# Altium footprint library Amirreza.PcbLib: 524 footprints (part 31 of 33)
Each footprint in its own frame and in the unit in brackets; x right, y up, seen from the top. Pads: shape width x height; smd on the part's side, far side on the other; paste and mask are expansions set on the pad; w line width, h text height; cw(c..) or ccw(c..) is an arc to the next point about the centre after c.
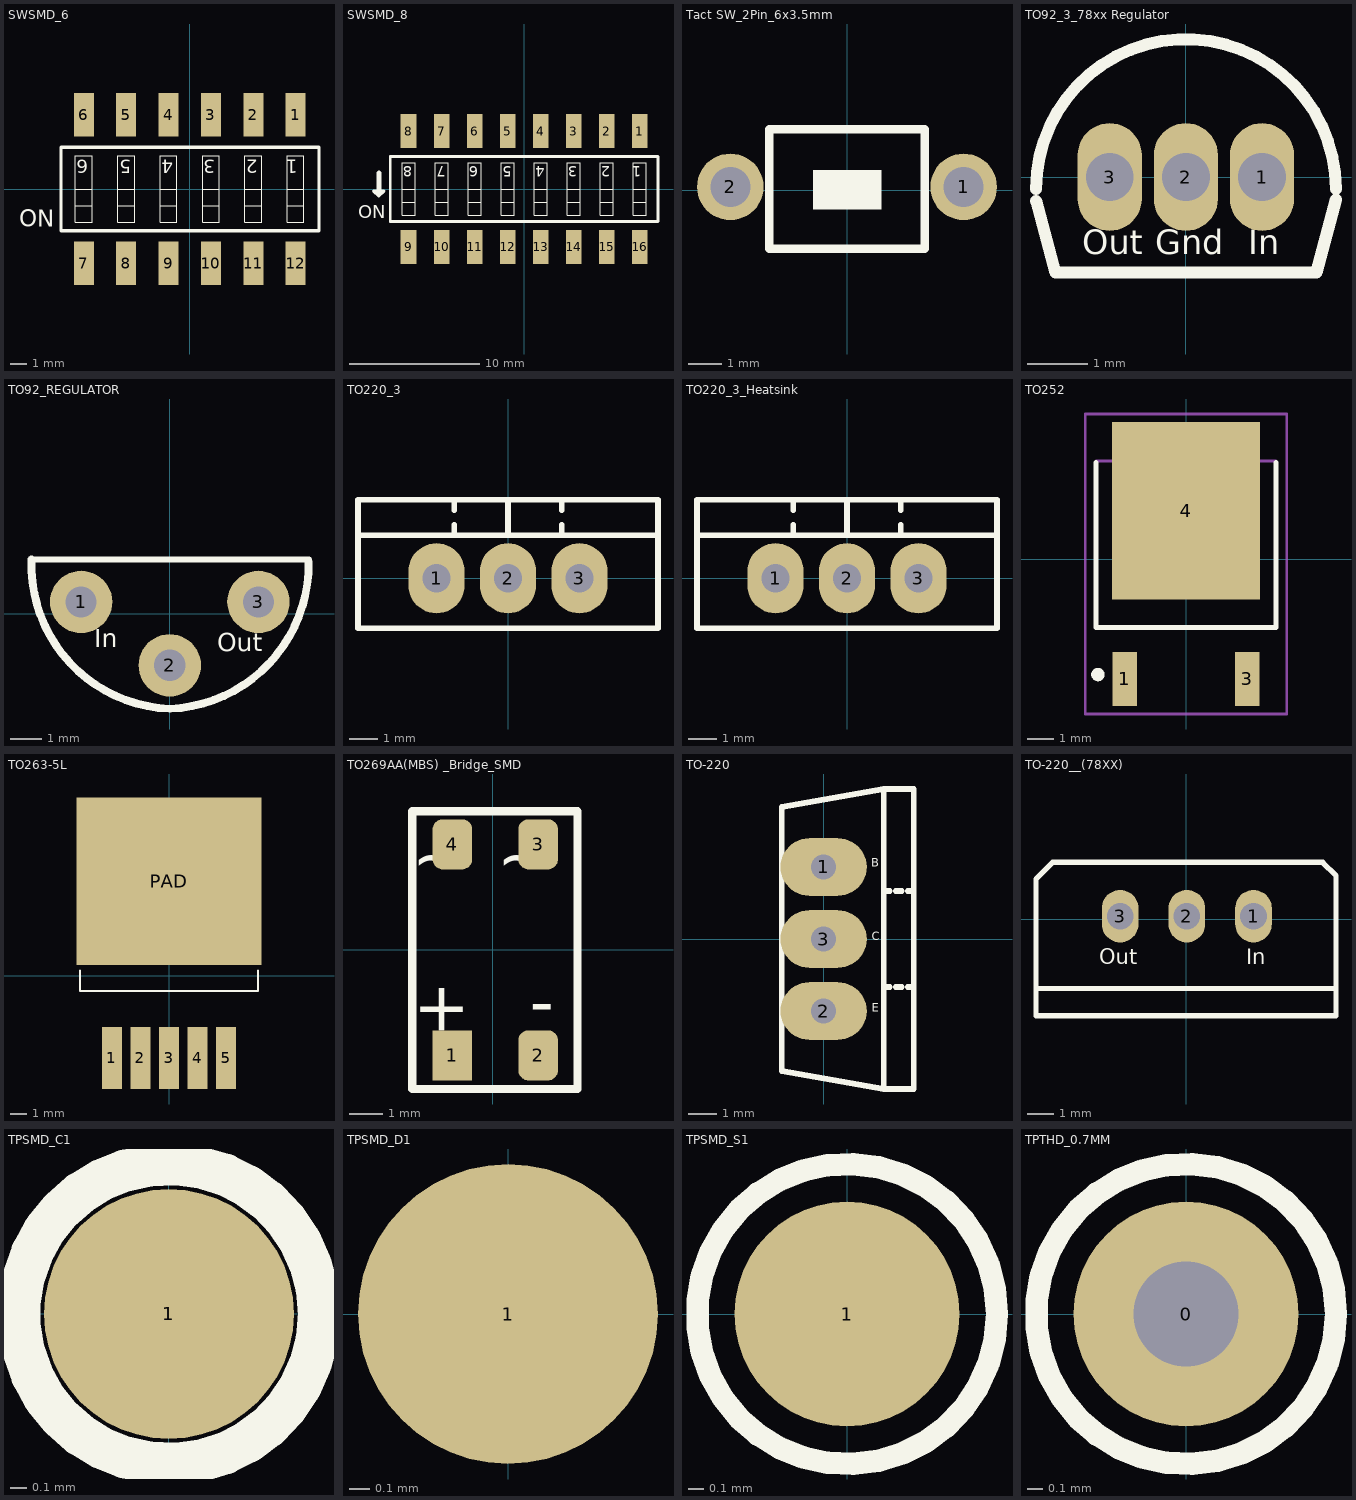
[diagram p30: the footprints below, top view; thin cyan lines are the x and y axes]

## SWSMD_6 [mm]
pads (12):
  rect 1.2x2.6 smd: 1(6.35,4.45) 2(3.81,4.45) 3(1.27,4.45) 4(-1.27,4.45) 5(-3.81,4.45) 6(-6.35,4.45) 7(-6.35,-4.45) 8(-3.81,-4.45) 9(-1.27,-4.45) 10(1.27,-4.45) 11(3.81,-4.45) 12(6.35,-4.45)
Top Overlay:
  lines w0.025: -6.85,-1 -5.85,-1 ; -6.85,0 -5.85,0 ; -4.31,-1 -3.31,-1 ; -4.31,0 -3.31,0 ; -1.77,-1 -0.77,-1 ; -1.77,0 -0.77,0 ; 0.77,-1 1.77,-1 ; 0.77,0 1.77,0 ; 3.31,-1 4.31,-1 ; 3.31,0 4.31,0 ; 5.85,-1 6.85,-1 ; 5.85,0 6.85,0 ; -6.85,-2 -6.85,2 -5.85,2 -5.85,-2 -6.85,-2 ; -4.31,-2 -4.31,2 -3.31,2 -3.31,-2 -4.31,-2 ; -1.77,-2 -1.77,2 -0.77,2 -0.77,-2 -1.77,-2 ; 0.77,-2 0.77,2 1.77,2 1.77,-2 0.77,-2 ; 3.31,-2 3.31,2 4.31,2 4.31,-2 3.31,-2 ; 5.85,-2 5.85,2 6.85,2 6.85,-2 5.85,-2
  lines w0.2: -7.722,-2.5 -7.722,2.5 7.75,2.5 7.75,-2.5 -7.722,-2.5
  text "ON" at -10.236,-2.256 h1
  text "6" at -6.071,1.758 h0.8
  text "5" at -3.5,1.755 h0.8
  text "4" at -0.975,1.755 h0.8
  text "3" at 1.524,1.758 h0.8
  text "2" at 4.089,1.758 h0.8
  text "1" at 6.475,1.755 h0.8
3D body "User Library-DIP-Schalter SMD 6polig RM2,54.step": height 4.22, standoff 0.02, extent -7.62,-3.861 7.62,3.759

## SWSMD_8 [mm]
pads (16):
  rect 1.2x2.6 smd: 1(8.89,4.45) 2(6.35,4.45) 3(3.81,4.45) 4(1.27,4.45) 5(-1.27,4.45) 6(-3.81,4.45) 7(-6.35,4.45) 8(-8.89,4.45) 9(-8.89,-4.45) 10(-6.35,-4.45) 11(-3.81,-4.45) 12(-1.27,-4.45) 13(1.27,-4.45) 14(3.81,-4.45) 15(6.35,-4.45) 16(8.89,-4.45)
Top Overlay:
  lines w0.025: -9.39,-1 -8.39,-1 ; -9.39,0 -8.39,0 ; -6.85,-1 -5.85,-1 ; -6.85,0 -5.85,0 ; -4.31,-1 -3.31,-1 ; -4.31,0 -3.31,0 ; -1.77,-1 -0.77,-1 ; -1.77,0 -0.77,0 ; 0.77,-1 1.77,-1 ; 0.77,0 1.77,0 ; 3.31,-1 4.31,-1 ; 3.31,0 4.31,0 ; 5.85,-1 6.85,-1 ; 5.85,0 6.85,0 ; 8.39,-1 9.39,-1 ; 8.39,0 9.39,0 ; -9.39,-2 -9.39,2 -8.39,2 -8.39,-2 -9.39,-2 ; -6.85,-2 -6.85,2 -5.85,2 -5.85,-2 -6.85,-2 ; -4.31,-2 -4.31,2 -3.31,2 -3.31,-2 -4.31,-2 ; -1.77,-2 -1.77,2 -0.77,2 -0.77,-2 -1.77,-2 ; 0.77,-2 0.77,2 1.77,2 1.77,-2 0.77,-2 ; 3.31,-2 3.31,2 4.31,2 4.31,-2 3.31,-2 ; 5.85,-2 5.85,2 6.85,2 6.85,-2 5.85,-2 ; 8.39,-2 8.39,2 9.39,2 9.39,-2 8.39,-2
  lines w0.2: -10.29,-2.5 -10.29,2.5 10.29,2.5 10.29,-2.5 -10.29,-2.5
  lines w0.254: -11.56,-0.157 -10.798,-0.157 -11.179,-0.538 -11.56,-0.157
  lines w0.381: -11.179,-0.411 -11.179,1.24
  text "8" at -8.611,1.758 h0.8
  text "7" at -6.04,1.755 h0.8
  text "ON" at -12.776,-2.256 h1
  text "6" at -3.531,1.758 h0.8
  text "5" at -0.96,1.755 h0.8
  text "4" at 1.565,1.755 h0.8
  text "3" at 4.064,1.758 h0.8
  text "2" at 6.629,1.758 h0.8
  text "1" at 9.015,1.755 h0.8
3D body "User Library-DIP-Schalter SMD 8polig RM2,54.step": height 4.19, standoff -0.01, extent -10.16,-3.81 10.16,3.81

## Tact SW_2Pin_6x3.5mm [mm]
pads (2):
  round 2 hole 1.2: 1(3.5,0.102) 2(-3.5,0.102)
Top Overlay:
  rectangle: -1.016,-0.584 1.041,0.61
  lines w0.254: -2.337,-1.753 2.337,-1.753 2.337,1.829 -2.337,1.829 -2.337,-1.753

## TO92_3_78xx Regulator [mm] "TO-92, SOT54"
pads (3):
  oval 1.07x1.8 hole 0.8 mask+0.1: 1(1.27,0) 2(0,0) 3(-1.27,0)
Top Overlay:
  lines w0.2: -2.5,-0.2 cw(c0,-0.2) 2.5,-0.2 ; -2.497,-0.399 -2.178,-1.589 2.178,-1.589 2.504,-0.374
  text "Gnd" at -0.508,-1.422 h0.7
  text "In" at 1.041,-1.422 h0.7
  text "Out" at -1.727,-1.422 h0.7
3D body "User Library-KSP92 Transistors PNP TO-92 3L (2,54mm).step": height 12.82, standoff -6.7, extent -2.38,-1.45 2.38,2.18

## TO92_REGULATOR [mm]
pads (3):
  round 2 hole 1: 1(-2.84,0.373) 2(0,-1.659) 3(2.84,0.373)
Top Overlay:
  lines w0.2: -4.426,1.728 4.449,1.728
  lines w0.254: -4.426,1.728 ccw(c0.175,1.553) 0,-3.048 ccw(c-0.191,1.587) 4.448,1.651
  text "Out" at 1.524,-1.397 h1
  text "In" at -2.413,-1.27 h1

## TO220_3 [mm] "TO-220 3 LEAD, TO-262, pitch: 2.54mm  10x4.5mm"
pads (3):
  oval 2x2.5 hole 1: 1(-2.54,0) 2(0,0) 3(2.54,0)
Top Overlay:
  lines w0.2: -5.334,1.524 5.334,1.524 ; -1.905,1.524 -1.905,1.905 ; -1.905,2.413 -1.905,2.794 ; 0,1.524 0,2.794 ; 1.905,1.524 1.905,1.905 ; 1.905,2.413 1.905,2.794 ; -5.334,-1.778 5.334,-1.778 5.334,2.794 -5.334,2.794 -5.334,-1.778
3D body "User Library-TO3B_(TO220)_1.step": height 19, standoff -9.4, extent -5.2,-1.85 5.2,2.65

## TO220_3_Heatsink [mm] "TO-220 3 LEAD, TO-262, pitch: 2.54mm  10x4.5mm"
pads (3):
  oval 2x2.5 hole 1: 1(-2.54,0) 2(0,0) 3(2.54,0)
Top Overlay:
  lines w0.2: -5.334,1.524 5.334,1.524 ; -1.905,1.524 -1.905,1.905 ; -1.905,2.413 -1.905,2.794 ; 0,1.524 0,2.794 ; 1.905,1.524 1.905,1.905 ; 1.905,2.413 1.905,2.794 ; -5.334,-1.778 -5.334,2.794 5.334,2.794 5.334,-1.778 -5.334,-1.778
3D body "User Library-TO3B_(TO220)_1.step": height 19, standoff -9.4, extent -5.2,-1.85 5.2,2.65
3D body "v5629w220.stp": height 25, standoff -3.5, extent -6,1.524 6,8.124

## TO252 [mm]
pads (3):
  rect 0.9x2 smd: 1(-2.28,-4.465) 3(2.28,-4.465)
  rect 5.5x6.6 smd: 4(0,1.8)
Top Overlay:
  circle w0.25: c-3.28,-4.3 r0.125
  lines w0.2: -3.35,3.6 -3.35,-2.55 3.35,-2.55 3.35,3.6
Mechanical 13:
  lines w0.102: -3.75,5.393 -3.75,-5.77 3.75,-5.77 3.75,5.393 ; -3.75,5.405 3.75,5.405 ; -3.35,-2.55 3.35,-2.55 3.35,3.65 -3.35,3.65 -3.35,-2.55
Mechanical 15:
  lines w0.1: -0.5,0 0.5,0 ; 0,-0.5 0,0.5
3D body "User Library-DPAK-1.step": height 2.39, standoff -0.02, extent -3.27,-5.061 3.27,4.878

## TO263-5L [mm]
pads (6):
  rect 1.2x3.7 smd: 1(-3.404,-4.9) 2(-1.702,-4.9) 3(0,-4.9) 4(1.702,-4.9) 5(3.404,-4.9)
  rect 11x10 smd: PAD(0,5.633)
Top Overlay:
  lines w0.127: -5.3,0.298 -5.3,-0.902 -3.4,-0.902 -1.7,-0.902 0,-0.902 1.7,-0.902 3.4,-0.902 5.3,-0.902 5.3,0.298
3D body "User Library-P2PAK_A (1).step": height 4.57, standoff 0.03, extent -5.1,-6.106 5.1,9.319

## TO269AA(MBS) _Bridge_SMD [mm]
pads (4):
  rect 1.2x1.52 smd: 1(-1.223,-3.203)
  rrect50% 1.2x1.52 smd: 2(1.377,-3.203) 3(1.377,3.187) 4(-1.223,3.187)
Top Overlay:
  lines w0.254: -2.433,-4.219 2.567,-4.219 2.567,4.189 -2.433,4.189 -2.433,-4.219
  text "+" at -0.682,-1.162 h1.5
  text "-" at 1.858,-1.162 h1.5
  text "~" at -0.72,3.364 h1.5
  text "~" at 1.855,3.364 h1.5
3D body "User Library-moste3k.STEP": height 1.45, standoff -0.08, extent -2.547,-3.503 2.447,3.397

## TO-220 [mil]
pads (3):
  oval 120x80 hole 35: 1(0,100) 2(0,-100) 3(0,0)
Top Overlay:
  lines w7.87: 83.33,-66.67 91.67,-66.67 ; 83.33,66.67 91.67,66.67 ; 100,-66.67 108.33,-66.67 ; 100,66.67 108.33,66.67 ; 116.67,-66.67 125,-66.67 ; 116.67,66.67 125,66.67 ; 83.33,-208.33 125,-208.33 125,208.33 83.33,208.33 ; 83.33,-208.33 83.33,208.33 ; 83.33,-208.33 -58.33,-183.33 -58.33,183.33 83.33,208.33
  text "B" at 66,96 h19.68
  text "E" at 67,-105 h19.68
  text "C" at 67,-6 h19.68
3D body "CircuitWorks-TO-220HS.step": height 730, standoff -150, extent -54,-200 126,200

## TO-220__(78XX) [mm]
pads (3):
  oval 1.4x2 hole 1.016: 1(2.572,0.108) 2(0.032,0.108) 3(-2.508,0.108)
Top Overlay:
  lines w0.2: -5.715,-2.644 5.715,-2.644 ; -5.715,-3.683 5.715,-3.683 5.715,1.651 5.207,2.159 -5.08,2.159 -5.715,1.524 -5.715,-3.683
  text "Out" at -3.302,-1.905 h1
  text "In" at 2.286,-1.905 h1

## TPSMD_C1 [mm] "Test Point, SMD Pad, Circle, 1mm X 1mm"
pads (1):
  round 1.5 smd paste-1.016 mask+0.025: 1(0,0)
Top Overlay:
  circle w0.254: c0,0 r0.9

## TPSMD_D1 [mm] "Test Point, SMD Pad, Circle, 1mm X 1mm"
pads (1):
  round 1.5 smd paste-1.016 mask+0.025: 1(0,0)

## TPSMD_S1 [mm] "Test Point, SMD Pad, Circle, 1mm X 1mm"
pads (1):
  round 1.5 smd paste-1.016 mask+0.025: 1(0,0)
Top Overlay:
  circle w0.15: c0,0 r1

## TPTHD_0.7MM [mm] "Test Point, SMD Pad, Circle, 1mm X 1mm"
pads (1):
  round 1.5 hole 0.7 mask+0.102: 0(0,0)
Top Overlay:
  circle w0.15: c0,0 r1